# Altium footprint library Resistance.PcbLib: 47 footprints (part 1 of 3)
Each footprint in its own frame and in the unit in brackets; x right, y up, seen from the top. Pads: shape width x height; smd on the part's side, far side on the other; paste and mask are expansions set on the pad; w line width, h text height; cw(c..) or ccw(c..) is an arc to the next point about the centre after c.
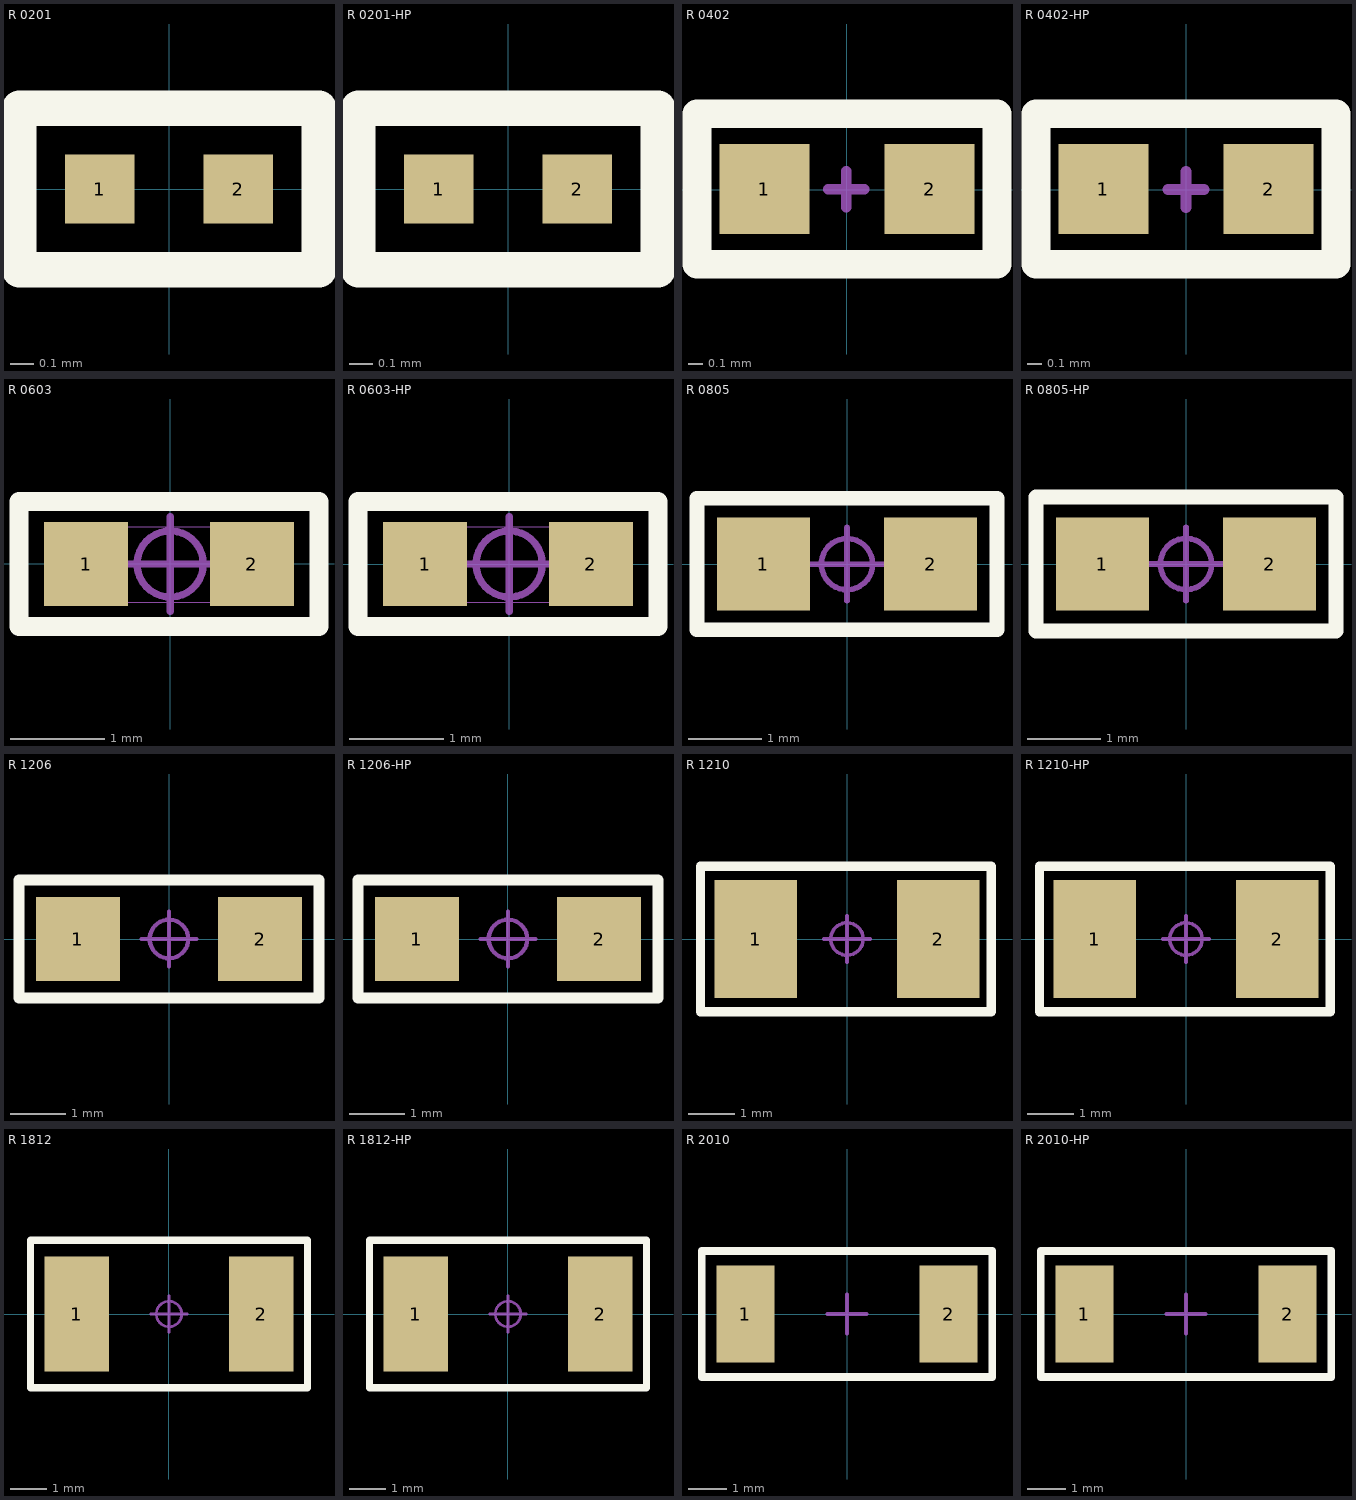
[diagram p0: the footprints below, top view; thin cyan lines are the x and y axes]

## R 0201 [mm] "1/20Wï¿½ï¿½Æ¬ï¿½ï¿½ï¿½ï¿½"
pads (2):
  rect 0.3x0.3 smd: 1(-0.3,0) 2(0.3,0)
Top Overlay:
  lines w0.152: -0.65,-0.35 -0.65,0.35 0.65,0.35 0.65,-0.35 -0.65,-0.35
3D body "R 0201.STEP": height 0.23, standoff 0, extent -0.3,-0.15 0.3,0.15

## R 0201-HP [mm] "1/20Wï¿½ß¾ï¿½ï¿½ï¿½ï¿½ï¿½Æ¬ï¿½ï¿½ï¿½ï¿½"
pads (2):
  rect 0.3x0.3 smd: 1(-0.3,0) 2(0.3,0)
Top Overlay:
  lines w0.152: -0.65,-0.35 -0.65,0.35 0.65,0.35 0.65,-0.35 -0.65,-0.35
3D body "R 0201-HP.STEP": height 0.23, standoff 0, extent -0.3,-0.15 0.3,0.15

## R 0402 [mm] "1/16Wï¿½ï¿½Æ¬ï¿½ï¿½ï¿½ï¿½"
pads (2):
  rect 0.635x0.635 smd: 1(-0.582,0.007) 2(0.587,0.007)
Top Overlay:
  lines w0.203: -1.059,-0.527 0.282,-0.527 1.064,-0.527 1.064,0.54 0.307,0.54 -1.059,0.54 -1.059,-0.527
Mechanical 15:
  lines w0.076: -0.13,0.005 0.124,0.005 ; -0.003,-0.122 -0.003,0.132
3D body "R 0402.STEP": height 0.3, standoff 0, extent -0.502,-0.245 0.498,0.255

## R 0402-HP [mil] "1/16Wï¿½ß¾ï¿½ï¿½ï¿½ï¿½ï¿½Æ¬ï¿½ï¿½ï¿½ï¿½"
pads (2):
  rect 25x25 smd: 1(-23,0.16) 2(23,0.16)
Top Overlay:
  lines w8: -41.8,-20.84 11,-20.84 41.8,-20.84 41.8,21.16 12,21.16 -41.8,21.16 -41.8,-20.84
Mechanical 15:
  lines w3: -5,0 5,0 ; 0,-5 0,5
3D body "R 0402-HP.STEP": height 11.85, standoff -0.09, extent -19.68,-9.84 19.7,9.85

## R 0603 [mil] "1/10Wï¿½ï¿½Æ¬ï¿½ï¿½ï¿½ï¿½"
pads (2):
  rect 35x35 smd: 1(-35,0) 2(34,0)
Top Overlay:
  lines w8: 17,-26 62,-26 62,26 17,26 -63,26 -63,-26 19.68,-26
Mechanical 13:
  lines w0.39: -31.5,-16 -31.5,15.49 31.49,15.49 31.49,-16 -31.5,-16
Mechanical 15:
  circle w3: c0,0 r13.78
  lines w3: -19.69,0 19.68,0 ; 0,-19.69 0,19.68
3D body "R 0603.STEP": height 15.79, standoff -0.13, extent -31.49,-15.74 31.5,15.75

## R 0603-HP [mil] "1/10Wï¿½ß¾ï¿½ï¿½ï¿½ï¿½ï¿½Æ¬ï¿½ï¿½ï¿½ï¿½"
pads (2):
  rect 35x35 smd: 1(-35,0) 2(34,0)
Top Overlay:
  lines w8: 17,26 62,26 62,-26 17,-26 -63,-26 -63,26 19.68,26
Mechanical 13:
  lines w0.39: -31.5,-16 31.5,-16 31.5,15.5 -31.5,15.5 -31.5,-16
Mechanical 15:
  circle w3: c0,0 r13.78
  lines w3: -19.68,0 19.68,0 ; 0,-19.68 0,19.68
3D body "R 0603-HP.STEP": height 15.79, standoff -0.16, extent -31.49,-15.74 31.5,15.75

## R 0805 [mm] "1/8Wï¿½ï¿½Æ¬ï¿½ï¿½ï¿½ï¿½"
pads (2):
  rect 1.27x1.27 smd: 1(-1.143,0) 2(1.143,0)
Top Overlay:
  lines w0.203: -2.05,-0.897 -2.05,0.899 2.05,0.899 2.05,-0.897 -2.05,-0.897
Mechanical 15:
  circle w0.076: c0,0 r0.35
  lines w0.076: -0.5,0 0.5,0 ; 0,-0.5 0,0.5
3D body "R 0805.STEP": height 0.5, standoff -0.01, extent -1,-0.625 1,0.625

## R 0805-HP [mil] "1/8Wï¿½ß¾ï¿½ï¿½ï¿½ï¿½ï¿½Æ¬ï¿½ï¿½ï¿½ï¿½"
pads (2):
  rect 50x50 smd: 1(-45,0) 2(45,0)
Top Overlay:
  lines w8: 20,-36 80.71,-36 80.71,36 20,36 ; 27.56,36 -80.71,36 -80.71,-36 35.43,-36
Mechanical 15:
  circle w3: c0,0 r13.78
  lines w3: -19.68,0 19.68,0 ; 0,-19.68 0,19.68
3D body "R 0805-HP.STEP": height 19.72, standoff -0.24, extent -39.37,-24.6 39.37,24.61

## R 1206 [mil] "1/4Wï¿½ï¿½Æ¬ï¿½ï¿½ï¿½ï¿½"
pads (2):
  rect 60x60 smd: 1(-65,0) 2(65,0)
Top Overlay:
  lines w8: -107,-42 -107,42 35,42 107,42 107,-42 35,-42 -107,-42
Mechanical 15:
  circle w3: c0,0 r13.78
  lines w3: -19.69,0 19.68,0 ; 0,-19.69 0,19.68
3D body "R 1206.STEP": height 21.69, standoff -0.24, extent -62.99,-31.49 63,31.5

## R 1206-HP [mil] "1/4Wï¿½ß¾ï¿½ï¿½ï¿½ï¿½ï¿½Æ¬ï¿½ï¿½ï¿½ï¿½"
pads (2):
  rect 60x60 smd: 1(-65,0) 2(65,0)
Top Overlay:
  lines w8: -107,-42 -107,42 35,42 107,42 107,-42 35,-42 -107,-42
Mechanical 15:
  circle w3: c0,0 r13.78
  lines w3: -19.68,0 19.68,0 ; 0,-19.68 0,19.68
3D body "R 1206-HP.STEP": height 21.69, standoff -0.32, extent -62.98,-31.49 63,31.5

## R 1210 [mil] "1/3Wï¿½ï¿½Æ¬ï¿½ï¿½ï¿½ï¿½"
pads (2):
  rect 70x100 smd: 1(-77.5,0) 2(77.5,0)
Top Overlay:
  lines w8: -124.5,-62 40.5,-62 122.5,-62 122.5,62 40.5,62 -124.5,62 -124.5,-62
Mechanical 15:
  circle w3: c0,0 r13.78
  lines w3: -19.68,0 19.68,0 ; 0,-19.68 0,19.69
3D body "R 1210.STEP": height 21.69, standoff -0.32, extent -62.99,-49.2 63,49.22

## R 1210-HP [mil] "1/3Wï¿½ß¾ï¿½ï¿½ï¿½ï¿½ï¿½Æ¬ï¿½ï¿½ï¿½ï¿½"
pads (2):
  rect 70x100 smd: 1(-77.5,0) 2(77.5,0)
Top Overlay:
  lines w8: 40.5,62 122.5,62 122.5,-62 40.5,-62 -124.5,-62 -124.5,62 47.24,62
Mechanical 15:
  circle w3: c0,0 r13.78
  lines w3: -19.68,0 19.68,0 ; 0,-19.68 0,19.68
3D body "R 1210-HP.STEP": height 21.69, standoff -0.47, extent -62.99,-49.21 63,49.22

## R 1812 [mil] "1/2Wï¿½ï¿½Æ¬ï¿½ï¿½ï¿½ï¿½"
pads (2):
  rect 70x125 smd: 1(-100,0) 2(100,0)
Top Overlay:
  lines w8: -150,-80 40,-80 50,-80 150,-80 150,80 50,80 40,80 -50,80 -70,80 -150,80 -150,-80
Mechanical 15:
  circle w3: c0,0 r13.78
  lines w3: -19.68,0 19.69,0 ; 0,-19.68 0,19.69
3D body "R 1812.STEP": height 21.69, standoff -0.47, extent -88.58,-62.99 88.59,63

## R 1812-HP [mil] "1/2Wï¿½ß¾ï¿½ï¿½ï¿½ï¿½ï¿½Æ¬ï¿½ï¿½ï¿½ï¿½"
pads (2):
  rect 70x125 smd: 1(-100,0) 2(100,0)
Top Overlay:
  lines w8: 40,-80 50,-80 ; 40,80 50,80 ; 50,-80 -150,-80 -150,80 -70,80 -50,80 50,80 ; 50,-80 150,-80 150,80 50,80
Mechanical 15:
  circle w3: c0,0 r13.78
  lines w3: -19.68,0 19.69,0 ; 0,-19.68 0,19.69
3D body "R 1812-HP.STEP": height 21.69, standoff -0.47, extent -88.58,-62.99 88.59,63

## R 2010 [mm] "3/4Wï¿½ï¿½Æ¬ï¿½ï¿½ï¿½ï¿½"
pads (2):
  rect 1.52x2.54 smd: 1(-2.665,0) 2(2.665,0)
Top Overlay:
  lines w0.203: -3.81,-1.651 1.27,-1.651 3.81,-1.651 3.81,-0.635 3.81,1.651 1.27,1.651 -3.81,1.651 -3.81,0.635 -3.81,-1.651
Mechanical 15:
  lines w0.1: -0.508,0 0.508,0 ; 0,-0.508 0,0.508
3D body "R 2010.STEP": height 0.55, standoff -0.01, extent -2.5,-1.25 2.5,1.25

## R 2010-HP [mm] "3/4Wï¿½ß¾ï¿½ï¿½ï¿½ï¿½ï¿½Æ¬ï¿½ï¿½ï¿½ï¿½"
pads (2):
  rect 1.52x2.54 smd: 1(-2.665,0) 2(2.665,0)
Top Overlay:
  lines w0.203: -3.81,-1.651 1.27,-1.651 3.81,-1.651 3.81,-0.635 3.81,1.651 1.27,1.651 -3.81,1.651 -3.81,0.635 -3.81,-1.651
Mechanical 15:
  lines w0.1: -0.508,0 0.508,0 ; 0,-0.508 0,0.508
3D body "R 2010-HP.STEP": height 0.55, standoff -0.01, extent -2.5,-1.25 2.5,1.25